# Altium footprint library 集大电协1.2.PcbLib: 175 footprints (part 1 of 11)
Each footprint in its own frame and in the unit in brackets; x right, y up, seen from the top. Pads: shape width x height; smd on the part's side, far side on the other; paste and mask are expansions set on the pad; w line width, h text height; cw(c..) or ccw(c..) is an arc to the next point about the centre after c.
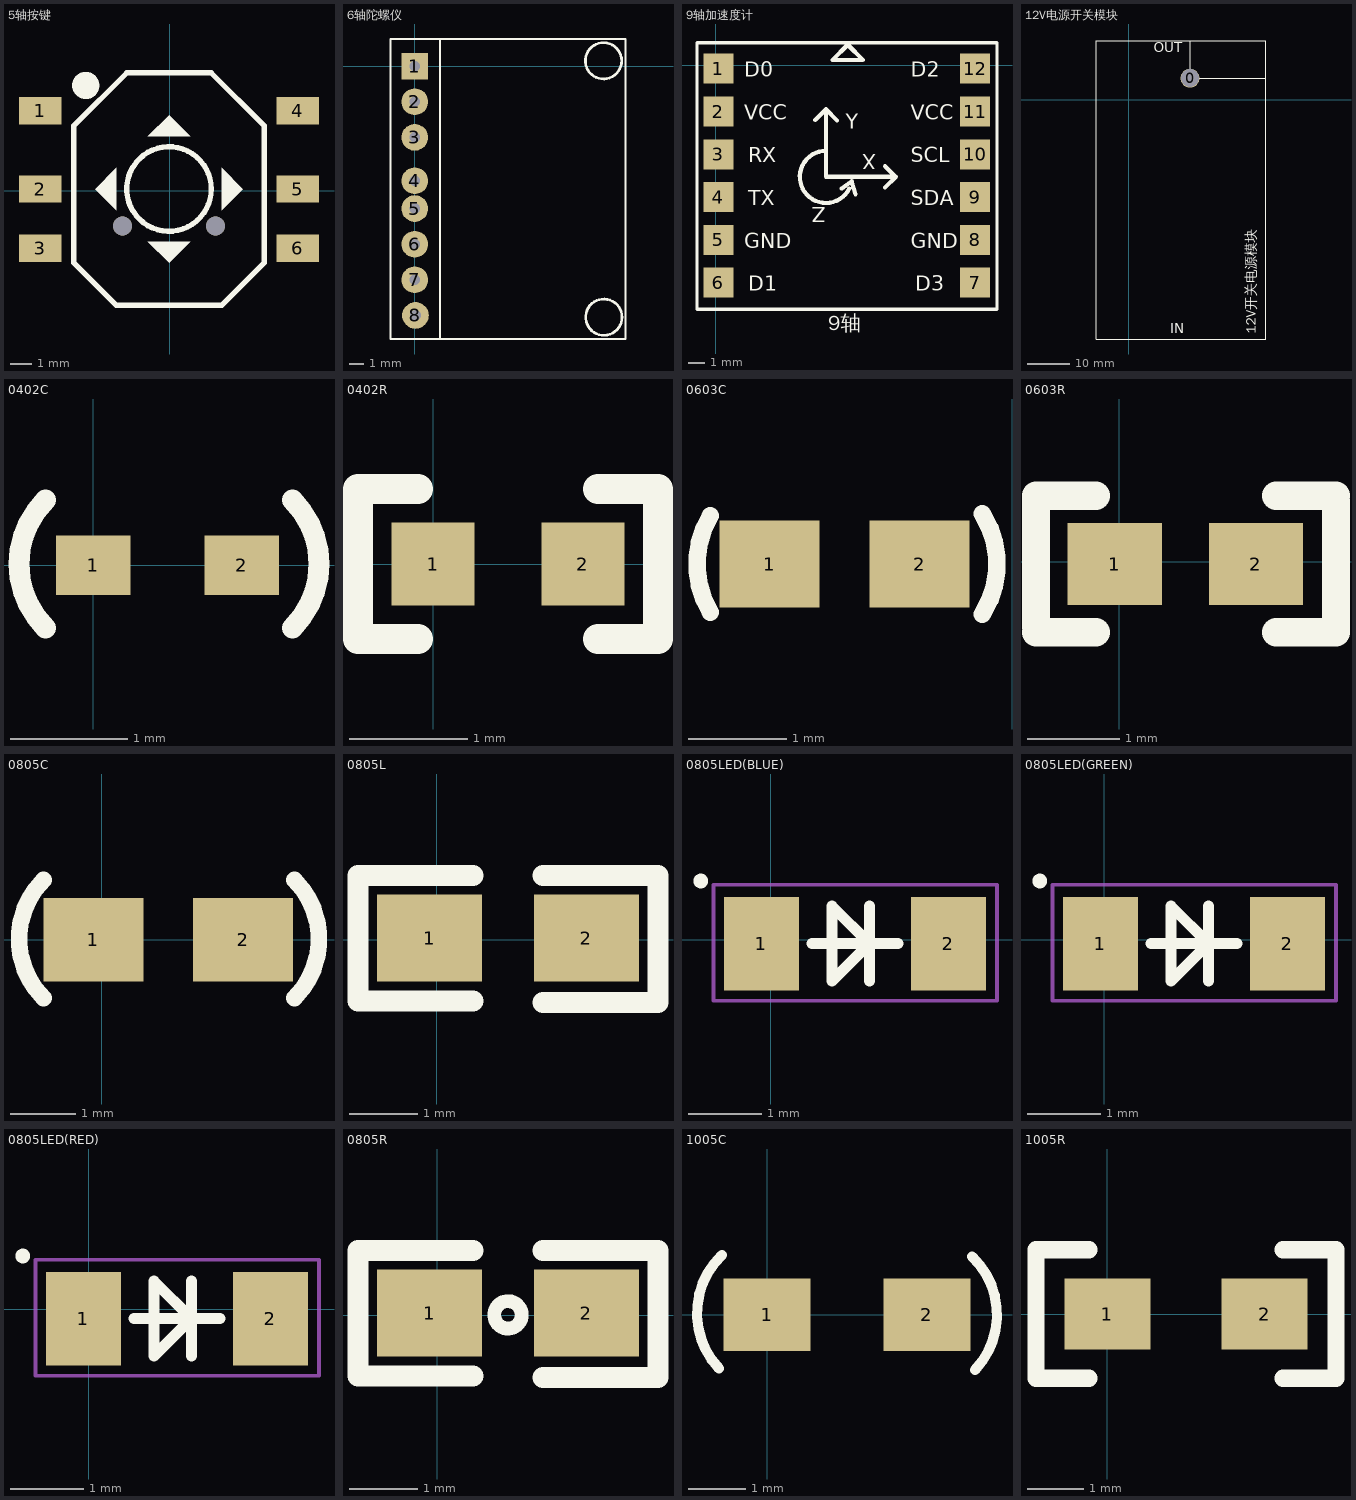
[diagram p0: the footprints below, top view; thin cyan lines are the x and y axes]

## 5轴按键 [mm]
pads (6):
  rect 2x1.3 smd: 1(-6.128,3.778) 2(-6.128,0.078) 3(-6.128,-2.722) 4(6.072,3.778) 5(6.072,0.078) 6(6.072,-2.722)
via 2.172,-1.672 diameter 0.9 hole 0.9
via -2.228,-1.672 diameter 0.9 hole 0.9
Top Overlay:
  circle w0.254: c-0.028,0.078 r2
  circle w1: c-3.969,4.978 r0.141
  region: -2.528,1.078 -3.528,0.078 -2.528,-0.922
  region: -1.028,-2.422 -0.028,-3.422 0.972,-2.422
  region: 2.472,-0.922 3.472,0.078 2.472,1.078
  region: 0.972,2.578 -0.028,3.578 -1.028,2.578
  lines w0.254: -4.528,-3.422 -4.528,3.078 -2.028,5.578 1.972,5.578 4.472,3.078 4.472,-3.422 2.472,-5.422 -2.528,-5.422 -4.528,-3.422

## 6轴陀螺仪 [mil]
pads (8):
  rect 75x75 hole 30: 1(0,0)
  round 75 hole 30: 2(0,-100) 3(0,-200) 4(0,-322) 5(0,-400) 6(0,-500) 7(0,-600) 8(2,-700)
Top Overlay:
  circle w7.8: c531,-705 r50.99
  circle w7.8: c530.01,15 r50.99
  lines w5: 71,-766.26 71,76.26 ; -67.9,-766.26 591.55,-766.26 591.55,76.26 -67.9,76.26 -67.9,-766.26
3D body: height 307.09, standoff 279.53, extent -46,-752.5 600,84.5
3D body "HDR1X8_2.54mm.STEP": height 398.11, standoff -56.22, extent -48,-749.99 52,50.01

## 9轴加速度计 [mil]
pads (12):
  rect 70x70 smd: 1(5.91,-7.81) 2(5.91,-107.81) 3(5.91,-207.81) 4(5.91,-307.81) 5(5.91,-407.81) 6(5.91,-507.81) 7(605.91,-507.81) 8(605.91,-407.81) 9(605.91,-307.81) 10(605.91,-207.81) 11(605.91,-107.81) 12(605.91,-7.81)
Top Overlay:
  lines w7.87: -44.09,-457.81 -44.09,-57.81 ; 656.91,-457.81 656.91,-58.81
  lines w8: -44.09,-457.81 -44.09,-569.88 656.91,-569.88 656.91,-457.81 ; -44.09,-57.81 -44.09,53.19 656.91,53.19 656.91,-58.81
  lines w10: 232.21,-127.54 257.21,-102.54 257.21,-260.54 420.21,-260.54 ; 257.21,-199.51 ccw(c257.21,-260.54) 311.8,-287.84 ; 258.21,-103.54 283.21,-128.54 ; 293.34,-287.92 317.21,-270.54 326.15,-301.09 ; 395.21,-285.54 420.21,-260.54 ; 395.21,-235.54 420.21,-260.54 ; 272.64,12.8 343.5,12.8 308.07,48.23 272.64,12.8
  text "9轴" at 262.8,-630.91 h60
  text "D3" at 465.91,-526.81 h35
  text "D2" at 455.91,-26.81 h35
  text "D1" at 75.91,-526.81 h35
  text "D0" at 65.91,-26.81 h35
  text "SCL" at 455.91,-226.81 h35
  text "SDA" at 455.91,-326.81 h35
  text "TX" at 75.91,-326.81 h35
  text "RX" at 75.91,-226.81 h35
  text "GND" at 455.91,-426.81 h35
  text "GND" at 65.91,-426.81 h35
  text "VCC" at 455.91,-126.81 h35
  text "VCC" at 65.91,-126.81 h35
  text "Z" at 256.89,-331.69 h35
  text "X" at 375.21,-207.54 h35
  text "Y" at 303.21,-148.54 h35
3D body: height 39.37, standoff 0, extent -9.84,-570.37 622.05,54.63
3D body "QFN-36B6R00x6R00.step": height 74.8, standoff 39.37, extent 305.12,-249.01 545.28,-8.85
3D body "SOT23-5M.step": height 86.61, standoff 39.37, extent 305.52,-428.3 415.75,-310.19
3D body "QFN_18L 3.5 x 3.5.step": height 62.99, standoff 39.37, extent 67.92,-470.47 211.62,-326.77

## 12V电源开关模块 [mm]
pads (1):
  round 4.5 hole 4.3: 0(14.5,5.1)
Top Overlay:
  lines w0.254: 14.5,5.1 32.5,5.1 ; 14.5,5.2 14.5,14 ; -7.8,-56.8 32.5,-56.8 32.5,14 -7.8,14 -7.8,-56.8
  text "IN" at 9.8,-56.3 h4
  text "OUT" at 5.9,10.4 h4
  text "12V开关电源模块" at 30.9,-55.6 h4

## 0402C [mil]
pads (2):
  rect 25x20 smd: 1(0,0) 2(50,0)
Top Overlay:
  lines w7: -16,-21 cw(c5.5,0.5) -16,22 ; 67,-21 ccw(c45.5,0.5) 67,22

## 0402R [mm]
pads (2):
  rect 0.7x0.7 smd: 1(0,0) 2(1.27,0)
Top Overlay:
  lines w0.254: -0.127,-0.635 -0.635,-0.635 -0.635,0.635 -0.127,0.635 ; 1.397,-0.635 1.905,-0.635 1.905,0.635 1.397,0.635
3D body "R0402.STEP": height 0.35, standoff 0, extent 0.211,-0.199 1.211,0.301

## 0603C [mil]
pads (2):
  rect 40x35 smd: 1(-97,-282) 2(-37,-282)
Top Overlay:
  lines w7: -120.7,-301.22 cw(c-88.5,-282) -120.7,-262.78 ; -11.84,-302.1 ccw(c-43.5,-282) -11.84,-261.9
3D body "Capacitor 0603 SMD.step": height 35.04, standoff -0.39, extent -116.67,-299.4 -14.3,-260.03

## 0603R [mil]
pads (2):
  rect 40x35 smd: 1(-2,-1) 2(58,-1)
Top Overlay:
  lines w12: -35.43,-30 -10,-30 ; -35.43,-27.56 -35.43,28 -10,28 ; 66.57,-30 92,-30 92,25.56 ; 66.57,28 92,28
3D body "User Library-RES_1609-0603.STEP": height 22.05, standoff 0, extent -5.46,-16.74 61.47,14.75

## 0805C [mil]
pads (2):
  rect 60x50 smd: 1(-5,0) 2(85,0)
Top Overlay:
  lines w10: -34.99,-35 cw(c0.51,0.5) -34.99,36 ; 115.93,-35 ccw(c80.43,0.5) 115.93,36
3D body "Capacitor 0805 SMD.step": height 36.61, standoff -0.39, extent -16.09,-26.27 102.02,28.85

## 0805L [mil]
pads (2):
  rect 60x50 smd: 1(-4.21,0.94) 2(85.79,0.94)
Top Overlay:
  lines w12: 20.79,-35.06 -45.21,-35.06 -45.21,36.94 20.79,36.94 ; 60.79,-36.06 126.79,-36.06 126.79,35.94 ; 60.79,36.94 126.79,36.94
3D body "0805L.STEP": height 19.68, standoff 0, extent 1.64,-23.6 80.38,25.61

## 0805LED(BLUE) [mil]
pads (2):
  rect 40x50 smd: 1(-4.95,-2) 2(95.05,-2)
Top Overlay:
  circle w3.94: c-37.4,31.5 r1.97
  lines w5.91: 22.05,-2 68.05,-2 ; 52.92,-22 52.92,18 ; 32.92,-22 52.92,-2 32.92,18 32.92,-22
Mechanical 15:
  lines w1.97: -30.51,-32.48 111.77,-32.48 121.06,-32.48 121.06,29.53 -30.51,29.53 -30.51,-32.48
3D body: height 35.43, standoff 0, extent 10.83,-19.71 77.76,15.72

## 0805LED(GREEN) [mil]
pads (2):
  rect 40x50 smd: 1(-2,-2) 2(98,-2)
Top Overlay:
  circle w3.94: c-34.45,31.5 r1.97
  lines w5.91: 25,-2 71,-2 ; 55.87,-22 55.87,18 ; 35.87,-22 35.87,18 55.87,-2 35.87,-22
Mechanical 15:
  lines w1.97: -27.56,-32.48 -27.56,29.53 124.02,29.53 124.02,-32.48 114.72,-32.48 -27.56,-32.48
3D body "led0805  green.step": height 43.31, standoff -0.5, extent 7,-27 87,23

## 0805LED(RED) [mil]
pads (2):
  rect 40x50 smd: 1(-2.98,-4.95) 2(97.02,-4.95)
Top Overlay:
  circle w3.94: c-35.43,28.54 r1.97
  lines w5.91: 24.02,-4.95 70.02,-4.95 ; 54.89,-24.95 54.89,15.05 ; 34.89,-24.95 54.89,-4.95 34.89,15.05 34.89,-24.95
Mechanical 15:
  lines w1.97: -28.54,-35.43 113.74,-35.43 123.03,-35.43 123.03,26.57 -28.54,26.57 -28.54,-35.43
3D body "User Library-LTST-C190EKT.STEP": height 35.43, standoff 0, extent 12.79,-24.6 79.73,10.83

## 0805R [mil]
pads (2):
  rect 60x50 smd: 1(-4.51,1.2) 2(85.49,1.2)
Top Overlay:
  circle w7.87: c40.49,0.2 r7.87
  lines w12: 20.49,-34.8 -45.51,-34.8 -45.51,37.2 20.49,37.2 ; 60.49,-35.8 126.49,-35.8 126.49,36.2 ; 60.49,37.2 126.49,37.2
3D body "0805_res.STEP": height 17.76, standoff 0, extent -0.57,-23.4 78.17,25.81

## 1005C [mil]
pads (2):
  rect 60x50 smd: 1(0,0) 2(110,0)
Top Overlay:
  lines w7: -33,-37 cw(c7,1) -31,41 ; 141,40 cw(c103,0) 143,-38

## 1005R [mil]
pads (2):
  rect 60x50 smd: 1(0,0) 2(110,0)
Top Overlay:
  lines w12: -13,-45 -50,-45 -50,45 -13,45 ; 123,-45 160,-45 160,45 123,45